# Altium footprint library Capacitors.PcbLib: 15 footprints
Each footprint in its own frame and in the unit in brackets; x right, y up, seen from the top. Pads: shape width x height; smd on the part's side, far side on the other; paste and mask are expansions set on the pad; w line width, h text height; cw(c..) or ccw(c..) is an arc to the next point about the centre after c.
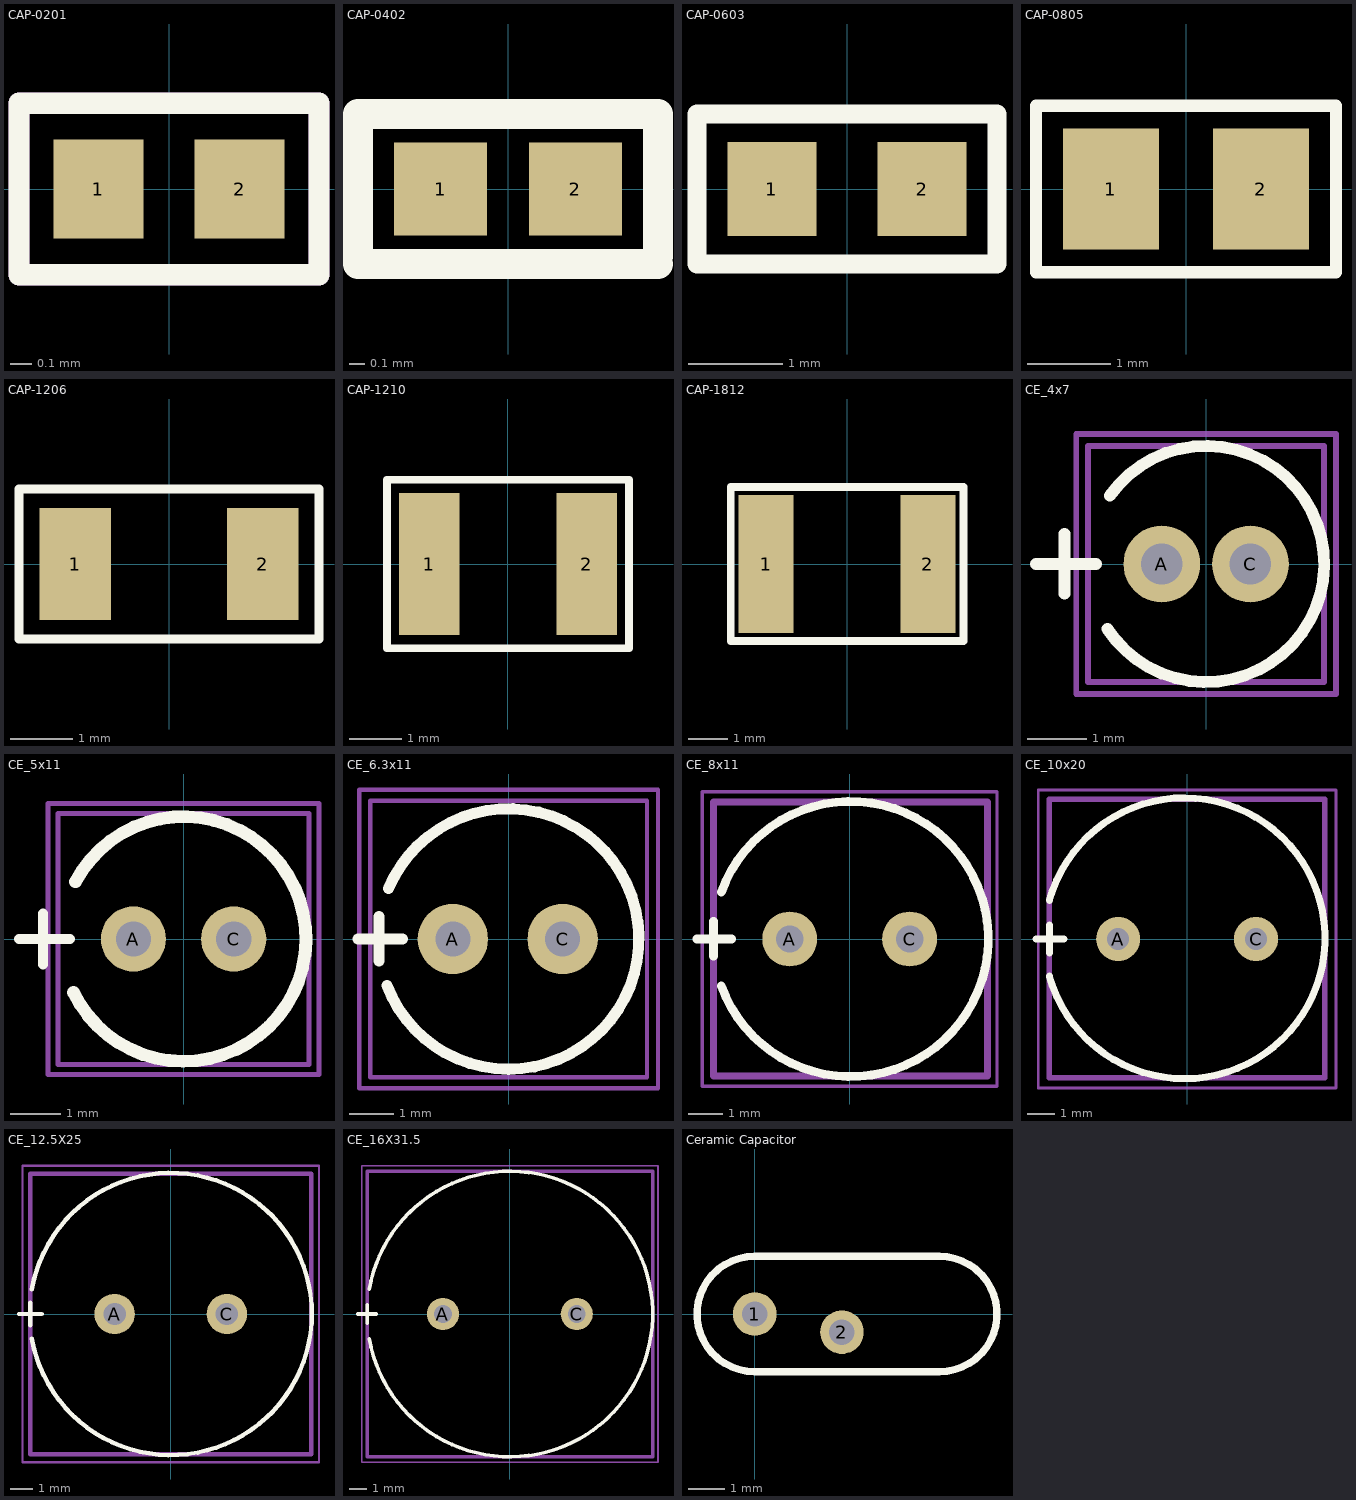
[diagram p0: the footprints below, top view; thin cyan lines are the x and y axes]

## CAP-0201 [mm] "Standard 0201 capacitor"
height 0.33
pads (2):
  rect 0.42x0.46 smd: 1(-0.33,0) 2(0.33,0)
Top Overlay:
  lines w0.1: -0.7,-0.4 0.7,-0.4 0.7,0.4 -0.7,0.4 -0.7,-0.4
Top Assembly:
  lines w0.1: -0.7,-0.4 0.7,-0.4 0.7,0.4 -0.7,0.4 -0.7,-0.4
Top Courtyard:
  lines w0.1: -0.7,-0.4 -0.7,0.4 0.7,0.4 0.7,-0.4 -0.7,-0.4
Top Designator:
  text ".Designator" at -1.25,-0.083 h0.25
3D body "CAP 0201.STEP": height 0.3, standoff 0, extent -0.3,-0.15 0.3,0.15

## CAP-0402 [mm] "Standard 0402 capacitor"
height 0.55
pads (2):
  rect 0.62x0.62 smd: 1(-0.45,0) 2(0.45,0)
Top Overlay:
  lines w0.2: 1,-0.5 -1,-0.5 -1,0.5 1,0.5 1,-0.45
Top Assembly:
  lines w0.1: -1,-0.5 1,-0.5 1,0.5 -1,0.5 -1,-0.5
Top Courtyard:
  lines w0.1: -1,-0.5 -1,0.5 1,0.5 1,-0.5 -1,-0.5
Top Designator:
  text ".Designator" at -1.999,-0.133 h0.4
3D body "0402 cap.STEP": height 0.52, standoff 0, extent -0.5,-0.262 0.5,0.262

## CAP-0603 [mm] "Standard 0603 capacitor"
height 1
pads (2):
  rect 0.95x1 smd: 1(-0.8,0) 2(0.8,0)
Top Overlay:
  lines w0.2: -1.6,-0.8 1.6,-0.8 1.6,0.8 -1.6,0.8 -1.6,-0.8
Top Assembly:
  lines w0.1: -1.6,-0.8 -1.6,0.8 1.6,0.8 1.6,-0.8 -1.6,-0.8
Top Courtyard:
  lines w0.1: -1.6,-0.8 1.6,-0.8 1.6,0.8 -1.6,0.8 -1.6,-0.8
Top Designator:
  text ".Designator" at -3.003,-0.2 h0.6
3D body "0603 cap.STEP": height 0.82, standoff 0, extent -0.8,-0.412 0.8,0.412

## CAP-0805 [mm] "Standard 0805 capacitor"
height 1.45
pads (2):
  rect 1.15x1.45 smd: 1(-0.9,0) 2(0.9,0)
Top Overlay:
  lines w0.15: -1.8,-1 1.8,-1 1.8,1 -1.8,1 -1.8,-1
Top Assembly:
  lines w0.1: -1.8,-1 -1.8,1 1.8,1 1.8,-1 -1.8,-1
Top Courtyard:
  lines w0.1: -1.8,-1 1.8,-1 1.8,1 -1.8,1 -1.8,-1
Top Designator:
  text ".Designator" at -4.973,-0.346 h1
3D body "0805 cap.STEP": height 1.26, standoff -0.02, extent -1,-0.637 1,0.637

## CAP-1206 [mm] "Standard 1206 capacitor"
height 1.9
pads (2):
  rect 1.15x1.8 smd: 1(-1.5,0) 2(1.5,0)
Top Overlay:
  lines w0.15: -2.4,-1.2 -2.4,1.2 2.4,1.2 2.4,-1.2 -2.4,-1.2
Top Assembly:
  lines w0.1: -2.4,-1.2 -2.4,1.2 2.4,1.2 2.4,-1.2 -2.4,-1.2
Top Courtyard:
  lines w0.1: -2.4,-1.2 -2.4,1.2 2.4,1.2 2.4,-1.2 -2.4,-1.2
Top Designator:
  text ".Designator" at -4.998,-0.333 h1
3D body "CAP 1206-1mm.STEP": height 1, standoff 0, extent -1.6,-0.8 1.6,0.8

## CAP-1210 [mm] "Standard 1210 capacitor"
height 2.1
pads (2):
  rect 1.15x2.7 smd: 1(-1.5,0) 2(1.5,0)
Top Overlay:
  lines w0.15: -2.3,-1.6 -2.3,1.6 2.3,1.6 2.3,-1.6 -2.3,-1.6
Top Assembly:
  lines w0.1: -2.3,-1.6 -2.3,1.6 2.3,1.6 2.3,-1.6 -2.3,-1.6
Top Courtyard:
  lines w0.1: -2.3,-1.6 -2.3,1.6 2.3,1.6 2.3,-1.6 -2.3,-1.6
Top Designator:
  text ".Designator" at -5,-0.332 h1
3D body "CAP 1210-1mm.STEP": height 1, standoff 0, extent -1.6,-1.247 1.6,1.253

## CAP-1812 [mm]
height 1.8
pads (2):
  rect 1.4x3.5 smd: 1(-2.05,0) 2(2.05,0)
Top Overlay:
  lines w0.2: -2.945,-1.952 2.955,-1.952 2.955,1.953 -2.945,1.953 -2.945,-1.952
Top Assembly:
  lines w0.1: -2.945,-1.952 2.955,-1.952 2.955,1.953 -2.945,1.953 -2.945,-1.952
Top Courtyard:
  lines w0.1: -2.945,-1.952 -2.945,1.953 2.955,1.953 2.955,-1.952 -2.945,-1.952
Top Designator:
  text ".Designator" at -7.618,-0.508 h1.52
3D body "CAP 1812-1.35mm.STEP": height 1.35, standoff 0, extent -2.25,-1.6 2.25,1.6

## CE_4x7 [mm]
height 7
pads (2):
  round 1.3 hole 0.7: A(-0.75,0) C(0.75,0)
Top Overlay:
  lines w0.2: -2.881,0 -1.865,0 ; -2.4,-0.504 -2.4,0.512 ; -1.672,-1.098 ccw(c0,0) -1.633,1.155
Top Assembly:
  lines w0.1: -2,-2 2,-2 2,2 -2,2 -2,-2
Top Courtyard:
  lines w0.1: -2.2,-2.2 2.2,-2.2 2.2,2.2 -2.2,2.2 -2.2,-2.2
Top Designator:
  text ".Designator" at -5.018,-0.333 h1
3D body "User Library-Cap electrolitic radial 4x7.STEP": height 7.1, standoff -1.4, extent -1.999,-1.999 1.999,1.999

## CE_5x11 [mm]
height 11
pads (2):
  round 1.3 hole 0.7: A(-1,0) C(1,0)
Top Overlay:
  lines w0.2: -3.281,0 -2.265,0 ; -2.8,-0.504 -2.8,0.512
  lines w0.254: -2.195,-1.065 ccw(c0,0) -2.157,1.141
Top Assembly:
  lines w0.1: -2.5,-2.5 -2.5,2.5 2.5,2.5 2.5,-2.5 -2.5,-2.5
Top Courtyard:
  lines w0.1: -2.7,-2.7 2.7,-2.7 2.7,2.7 -2.7,2.7 -2.7,-2.7
Top Designator:
  text ".Designator" at -5.018,-0.333 h1
3D body "User Library-ECAP5_11_20.step": height 11, standoff -2.3, extent -2.5,-2.498 2.5,2.498

## CE_6.3x11 [mm]
height 11
pads (2):
  round 1.6 hole 0.8: A(-1.27,0) C(1.23,0)
Top Overlay:
  lines w0.254: -3.429,0 -2.413,0 ; -2.948,-0.504 -2.948,0.512 ; -2.771,-1.055 ccw(c0,0) -2.733,1.151
Top Assembly:
  lines w0.1: -3.15,-3.15 3.15,-3.15 3.15,3.15 -3.15,3.15 -3.15,-3.15
Top Courtyard:
  lines w0.1: -3.4,-3.4 -3.4,3.4 3.4,3.4 3.4,-3.4 -3.4,-3.4
Top Designator:
  text ".Designator" at -7.638,-0.508 h1.52
3D body "EC 6.3x11 P2.5 D0.5.STEP": height 11, standoff -1.8, extent -3.17,-3.15 3.13,3.15

## CE_8x11 [mm]
height 11
pads (2):
  round 1.6 hole 0.8: A(-1.75,0) C(1.75,0)
Top Overlay:
  lines w0.254: -4.455,0 -3.439,0 ; -3.974,-0.504 -3.974,0.512 ; -3.746,-1.374 ccw(c0.028,0) -3.746,1.374
Top Assembly:
  lines w0.2: -3.974,-3.998 4.028,-3.998 4.028,3.998 -3.974,3.998 -3.974,-3.998
Top Courtyard:
  lines w0.1: -4.3,-4.3 4.3,-4.3 4.3,4.3 -4.3,4.3 -4.3,-4.3
Top Designator:
  text ".Designator" at -7.618,-0.508 h1.52
3D body "User Library-Cap-EL(8x11_5-3_5).step": height 11.5, standoff -3.3, extent -4.002,-3.998 4,3.998

## CE_10x20 [mm]
height 20
pads (2):
  round 1.6 hole 0.8: A(-2.5,0) C(2.5,0)
Top Overlay:
  lines w0.254: -5.481,0 -4.465,0 ; -5,-1.347 ccw(c-0.094,0.026) -5,1.4 ; -5,-0.504 -5,0.512
Top Assembly:
  lines w0.2: -5,-5.033 -5,5.074 5,5.074 5,-5.033 -5,-5.033
Top Courtyard:
  lines w0.1: -5.4,-5.4 -5.4,5.4 5.4,5.4 5.4,-5.4 -5.4,-5.4
Top Designator:
  text ".Designator" at -7.59,-0.508 h1.52
3D body "User Library-CAP_Electrolytic_10X20 (1).SLDPRT": height 20.1, standoff -4.72, extent -5,-5 5,5

## CE_12.5X25 [mm]
height 25
pads (2):
  round 1.8 hole 1: A(-2.5,0) C(2.5,0)
Top Overlay:
  lines w0.2: -6.758,0 -5.742,0 ; -6.25,-0.508 -6.25,0.508 ; -6.186,-1.091 ccw(c0,0) -6.186,1.091
Top Assembly:
  lines w0.2: -6.25,-6.25 -6.25,6.25 6.252,6.25 6.252,-6.25 -6.25,-6.25
Top Courtyard:
  lines w0.1: -6.6,-6.6 6.6,-6.6 6.6,6.6 -6.6,6.6 -6.6,-6.6
Top Designator:
  text ".Designator" at -7.618,-0.508 h1.52
3D body "User Library-Cap-EL(12_5x25-5).step": height 25, standoff -3.3, extent -6.25,-6.25 6.252,6.25

## CE_16X31.5 [mm]
height 31.5
pads (2):
  round 1.8 hole 1: A(-3.75,0) C(3.75,0)
Top Overlay:
  lines w0.2: -8.508,0 -7.492,0 ; -8,-0.508 -8,0.508 ; -7.878,-1.389 ccw(c0,0) -7.878,1.389
Top Assembly:
  lines w0.2: -8,-8 8.002,-8 8.002,8 -8,8 -8,-8
Top Courtyard:
  lines w0.1: -8.3,-8.3 -8.3,8.3 8.3,8.3 8.3,-8.3 -8.3,-8.3
Top Designator:
  text ".Designator" at -7.618,-0.508 h1.52
3D body "User Library-Cap-EL(16x31_5-7_5)T.step": height 41, standoff -3, extent -8,-8 8.002,8

## Ceramic Capacitor [mm]
pads (2):
  round 1.2 hole 0.7: 1(0,0) 2(2.4,-0.5)
Top Overlay:
  lines w0.2: 0,-1.59 cw(c0,0) 0,1.59 5.08,1.59 cw(c5.08,0) 5.08,-1.59 0,-1.59
3D body "User Library-Cer-Cap2 (3_5x1_5).step": height 3.5, standoff -3, extent -0.55,-1.05 2.95,0.451